# Altium footprint library TYCO THD.PcbLib: 146 footprints (part 2 of 11)
Each footprint in its own frame and in the unit in brackets; x right, y up, seen from the top. Pads: shape width x height; smd on the part's side, far side on the other; paste and mask are expansions set on the pad; w line width, h text height; cw(c..) or ccw(c..) is an arc to the next point about the centre after c.
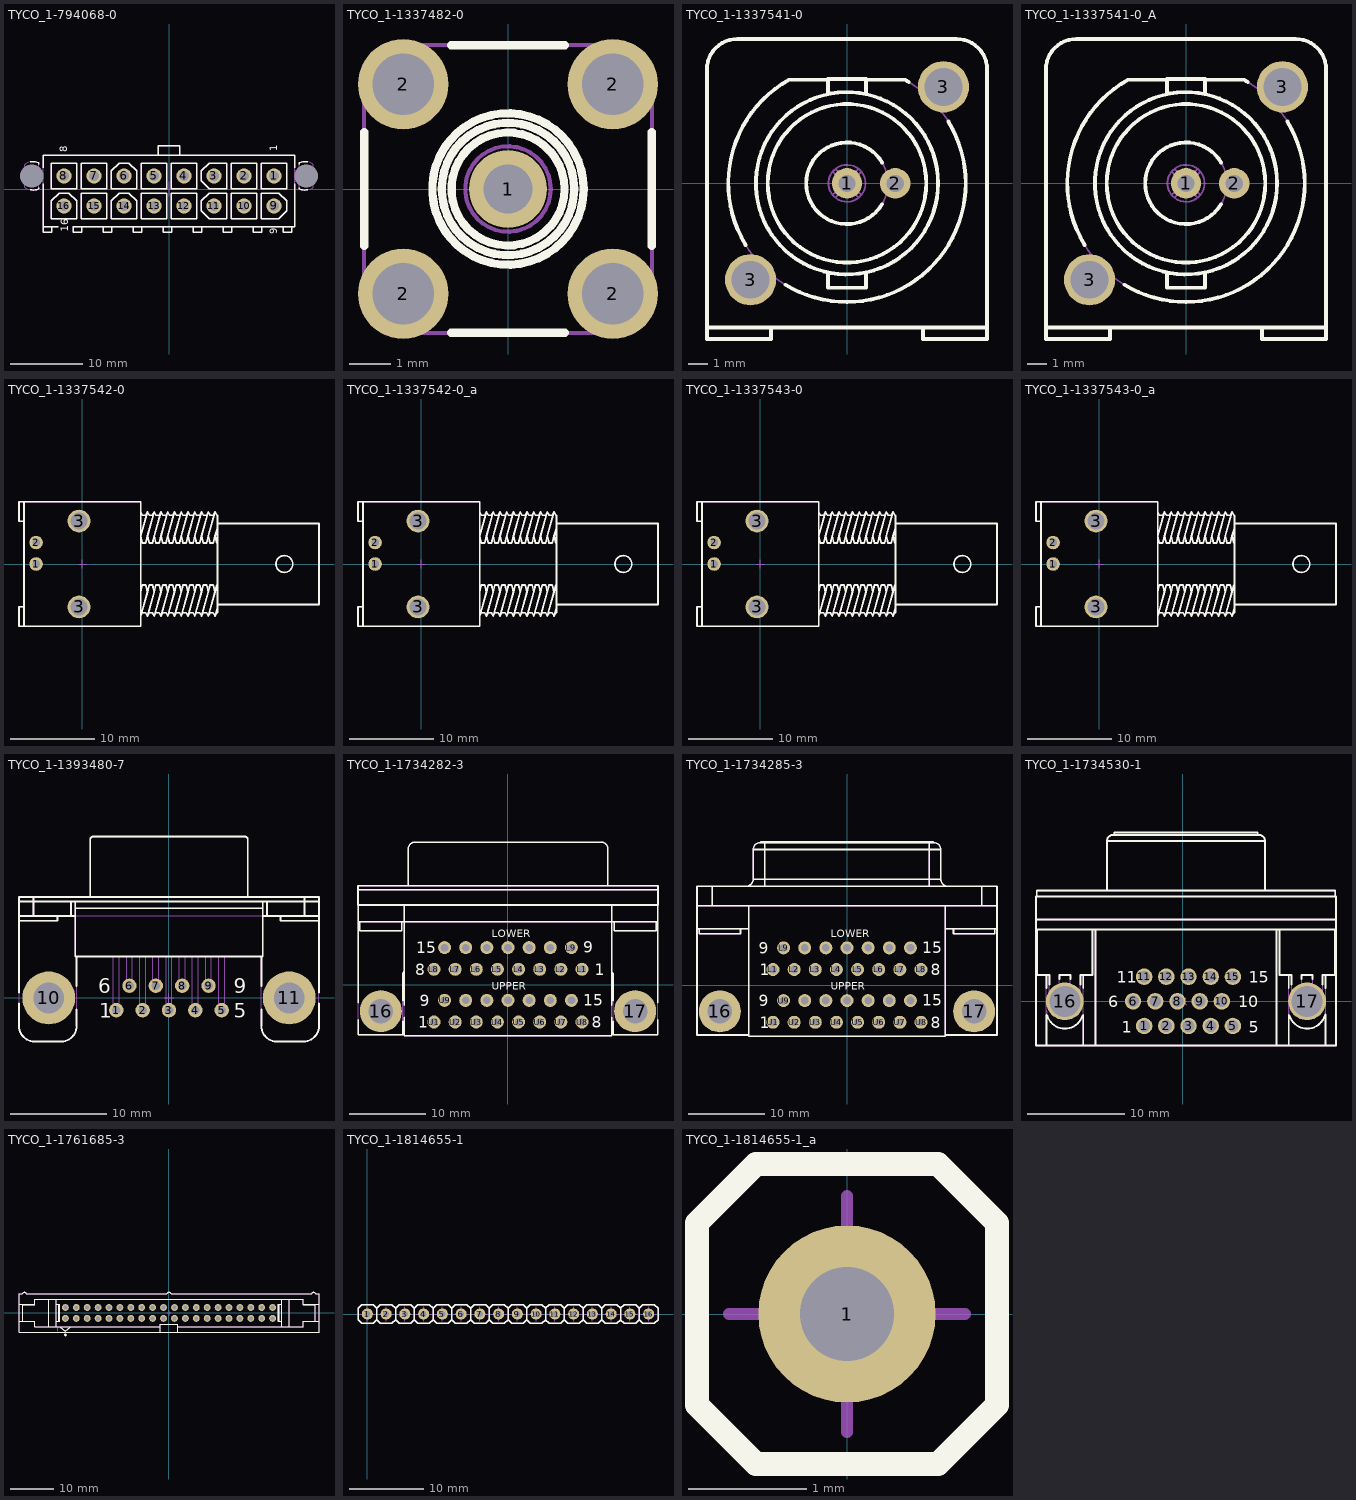
[diagram p1: the footprints below, top view; thin cyan lines are the x and y axes]

## TYCO_1-794068-0 [mm] "16 Circuits Double Row Vertiacal Mini-Universal MATE-N-LOK Connector"
height 14.25
pads (18):
  round 2.1 hole 1.4: 1(14.491,1.816) 2(10.351,1.816) 3(6.21,1.816) 4(2.07,1.816) 5(-2.07,1.816) 6(-6.21,1.816) 7(-10.351,1.816) 8(-14.491,1.816) 9(14.491,-2.324) 10(10.351,-2.324) 11(6.21,-2.324) 12(2.07,-2.324) 13(-2.07,-2.324) 14(-6.21,-2.324) 15(-10.351,-2.324) 16(-14.491,-2.324)
  round 0.5 hole 3.2 unplated mask+1.35: 17(18.941,1.816) 18(-18.941,1.816)
Top Overlay:
  lines w0.2: -19.174,-0.081 ccw(c-18.733,1.837) -17.996,0.012 -17.996,0.207 ; -19.174,3.735 cw(c-18.733,1.816) -17.996,3.642 -17.996,3.446 ; -17.341,-5.169 -17.341,0.746 ; -17.341,2.946 -17.341,4.661 ; -17.336,4.661 17.336,4.661 ; -16.193,-5.169 -16.193,-5.931 -17.336,-5.931 -17.336,-5.169 -15.31,-5.169 ; -13.31,-5.169 17.336,-5.169 ; -13.195,-5.169 -13.195,-5.931 -12.052,-5.931 -12.052,-5.169 ; -9.055,-5.169 -9.055,-5.931 -7.912,-5.931 -7.912,-5.169 ; -4.915,-5.169 -4.915,-5.931 -3.772,-5.931 -3.772,-5.169 ; -1.499,4.661 -1.499,5.956 1.499,5.956 1.499,4.661 ; -0.775,-5.169 -0.775,-5.931 0.368,-5.931 0.368,-5.169 ; 3.366,-5.169 3.366,-5.931 4.509,-5.931 4.509,-5.169 ; 7.506,-5.169 7.506,-5.931 8.649,-5.931 8.649,-5.169 ; 11.646,-5.169 11.646,-5.931 12.789,-5.931 12.789,-5.169 ; 15.786,-5.169 15.786,-5.931 16.929,-5.931 16.929,-5.169 ; 17.341,-5.169 17.341,0.746 ; 17.341,2.946 17.341,4.661 ; 17.996,0.207 17.996,0.012 ccw(c18.733,1.837) 19.174,-0.081 ; 17.996,3.446 17.996,3.642 cw(c18.733,1.816) 19.174,3.735 ; -16.269,-4.102 -16.269,-1.638 -15.177,-0.546 -13.805,-0.546 -12.713,-1.638 -12.713,-4.102 -16.269,-4.102 ; -16.269,0.038 -12.713,0.038 -12.713,3.594 -16.269,3.594 -16.269,0.038 ; -12.129,-4.102 -8.573,-4.102 -8.573,-0.546 -12.129,-0.546 -12.129,-4.102 ; -12.129,0.038 -8.573,0.038 -8.573,3.594 -12.129,3.594 -12.129,0.038 ; -7.988,-4.102 -7.988,-1.638 -6.896,-0.546 -5.525,-0.546 -4.432,-1.638 -4.432,-4.102 -7.988,-4.102 ; -7.988,0.038 -7.988,2.502 -6.896,3.594 -5.525,3.594 -4.432,2.502 -4.432,0.038 -7.988,0.038 ; -3.848,-4.102 -0.292,-4.102 -0.292,-0.546 -3.848,-0.546 -3.848,-4.102 ; -3.848,0.038 -0.292,0.038 -0.292,3.594 -3.848,3.594 -3.848,0.038 ; 0.292,-4.102 3.848,-4.102 3.848,-0.546 0.292,-0.546 0.292,-4.102 ; 0.292,0.038 3.848,0.038 3.848,3.594 0.292,3.594 0.292,0.038 ; 4.432,-3.01 4.432,-1.638 5.525,-0.546 7.988,-0.546 7.988,-4.102 5.525,-4.102 4.432,-3.01 ; 4.432,1.13 4.432,2.502 5.525,3.594 7.988,3.594 7.988,0.038 5.525,0.038 4.432,1.13 ; 8.573,-4.102 12.129,-4.102 12.129,-0.546 8.573,-0.546 8.573,-4.102 ; 8.573,0.038 12.129,0.038 12.129,3.594 8.573,3.594 8.573,0.038 ; 12.713,-4.102 15.177,-4.102 16.269,-3.01 16.269,-1.638 15.177,-0.546 12.713,-0.546 12.713,-4.102 ; 12.713,0.038 16.269,0.038 16.269,3.594 12.713,3.594 12.713,0.038
  text "1" at 14.943,5.231 h1
  text "16" at -13.92,-5.907 h1
  text "9" at 14.96,-6.216 h1
  text "8" at -14.022,5.07 h1
Mechanical 8:
  lines w0.1: -19.941,1.816 -18.941,1.816 ; -18.941,0.816 -18.941,1.816 ; -18.941,2.816 -18.941,1.816 ; -17.941,1.816 -18.941,1.816 ; -15.491,-2.324 -14.491,-2.324 ; -15.491,1.816 -14.491,1.816 ; -14.491,-3.324 -14.491,-2.324 ; -14.491,-1.324 -14.491,-2.324 ; -14.491,0.816 -14.491,1.816 ; -14.491,2.816 -14.491,1.816 ; -13.491,-2.324 -14.491,-2.324 ; -13.491,1.816 -14.491,1.816 ; -11.351,-2.324 -10.351,-2.324 ; -11.351,1.816 -10.351,1.816 ; -10.351,-3.324 -10.351,-2.324 ; -10.351,-1.324 -10.351,-2.324 ; -10.351,0.816 -10.351,1.816 ; -10.351,2.816 -10.351,1.816 ; -9.351,-2.324 -10.351,-2.324 ; -9.351,1.816 -10.351,1.816 ; -7.21,-2.324 -6.21,-2.324 ; -7.21,1.816 -6.21,1.816 ; -6.21,-3.324 -6.21,-2.324 ; -6.21,-1.324 -6.21,-2.324 ; -6.21,0.816 -6.21,1.816 ; -6.21,2.816 -6.21,1.816 ; -5.21,-2.324 -6.21,-2.324 ; -5.21,1.816 -6.21,1.816 ; -3.07,-2.324 -2.07,-2.324 ; -3.07,1.816 -2.07,1.816 ; -2.07,-3.324 -2.07,-2.324 ; -2.07,-1.324 -2.07,-2.324 ; -2.07,0.816 -2.07,1.816 ; -2.07,2.816 -2.07,1.816 ; -1.07,-2.324 -2.07,-2.324 ; -1.07,1.816 -2.07,1.816 ; -1,0 0,0 ; 0,-1 0,0 ; 0,1 0,0 ; 1,0 0,0 ; 1.07,-2.324 2.07,-2.324 ; 1.07,1.816 2.07,1.816 ; 2.07,-3.324 2.07,-2.324 ; 2.07,-1.324 2.07,-2.324 ; 2.07,0.816 2.07,1.816 ; 2.07,2.816 2.07,1.816 ; 3.07,-2.324 2.07,-2.324 ; 3.07,1.816 2.07,1.816 ; 5.21,-2.324 6.21,-2.324 ; 5.21,1.816 6.21,1.816 ; 6.21,-3.324 6.21,-2.324 ; 6.21,-1.324 6.21,-2.324 ; 6.21,0.816 6.21,1.816 ; 6.21,2.816 6.21,1.816 ; 7.21,-2.324 6.21,-2.324 ; 7.21,1.816 6.21,1.816 ; 9.351,-2.324 10.351,-2.324 ; 9.351,1.816 10.351,1.816 ; 10.351,-3.324 10.351,-2.324 ; 10.351,-1.324 10.351,-2.324 ; 10.351,0.816 10.351,1.816 ; 10.351,2.816 10.351,1.816 ; 11.351,-2.324 10.351,-2.324 ; 11.351,1.816 10.351,1.816 ; 13.491,-2.324 14.491,-2.324 ; 13.491,1.816 14.491,1.816 ; 14.491,-3.324 14.491,-2.324 ; 14.491,-1.324 14.491,-2.324 ; 14.491,0.816 14.491,1.816 ; 14.491,2.816 14.491,1.816 ; 15.491,-2.324 14.491,-2.324 ; 15.491,1.816 14.491,1.816 ; 17.941,1.816 18.941,1.816 ; 18.941,0.816 18.941,1.816 ; 18.941,2.816 18.941,1.816 ; 19.941,1.816 18.941,1.816
Mechanical 14:
  lines w0.1: -19.926,0.991 ccw(c-18.961,1.816) -17.996,0.991 ; -19.926,2.642 cw(c-18.961,1.816) -17.996,2.642 ; -17.336,1.054 -17.996,1.054 -17.996,-0.009 cw(c-18.733,1.816) -19.926,0.251 -19.926,3.381 cw(c-18.733,1.816) -17.996,3.642 -17.996,2.578 -17.336,2.578 ; -16.193,-5.169 -16.193,-5.931 -17.336,-5.931 -17.336,-5.169 ; -15.31,-5.169 -17.336,-5.169 ; -13.31,-5.169 17.336,-5.169 17.336,4.661 -17.336,4.661 -17.336,-5.169 ; -13.195,-5.169 -13.195,-5.931 -12.052,-5.931 -12.052,-5.169 ; -9.055,-5.169 -9.055,-5.931 -7.912,-5.931 -7.912,-5.169 ; -4.915,-5.169 -4.915,-5.931 -3.772,-5.931 -3.772,-5.169 ; -1.499,4.661 -1.499,5.956 1.499,5.956 1.499,4.661 ; -0.775,-5.169 -0.775,-5.931 0.368,-5.931 0.368,-5.169 ; 3.366,-5.169 3.366,-5.931 4.509,-5.931 4.509,-5.169 ; 7.506,-5.169 7.506,-5.931 8.649,-5.931 8.649,-5.169 ; 11.646,-5.169 11.646,-5.931 12.789,-5.931 12.789,-5.169 ; 15.786,-5.169 15.786,-5.931 16.929,-5.931 16.929,-5.169 ; 17.336,1.054 17.996,1.054 17.996,-0.009 ccw(c18.733,1.816) 19.926,0.251 19.926,3.381 ccw(c18.733,1.816) 17.996,3.642 17.996,2.578 17.336,2.578 ; 17.996,0.991 ccw(c18.961,1.816) 19.926,0.991 ; 17.996,2.642 cw(c18.961,1.816) 19.926,2.642 ; -16.269,-4.102 -16.269,-1.638 -15.177,-0.546 -13.805,-0.546 -12.713,-1.638 -12.713,-4.102 -16.269,-4.102 ; -16.269,0.038 -12.713,0.038 -12.713,3.594 -16.269,3.594 -16.269,0.038 ; -12.129,-4.102 -8.573,-4.102 -8.573,-0.546 -12.129,-0.546 -12.129,-4.102 ; -12.129,0.038 -8.573,0.038 -8.573,3.594 -12.129,3.594 -12.129,0.038 ; -7.988,-4.102 -4.432,-4.102 -4.432,-1.638 -5.525,-0.546 -6.896,-0.546 -7.988,-1.638 -7.988,-4.102 ; -7.988,0.038 -4.432,0.038 -4.432,2.502 -5.525,3.594 -6.896,3.594 -7.988,2.502 -7.988,0.038 ; -3.848,-4.102 -0.292,-4.102 -0.292,-0.546 -3.848,-0.546 -3.848,-4.102 ; -3.848,0.038 -0.292,0.038 -0.292,3.594 -3.848,3.594 -3.848,0.038 ; 0.292,-4.102 3.848,-4.102 3.848,-0.546 0.292,-0.546 0.292,-4.102 ; 0.292,0.038 3.848,0.038 3.848,3.594 0.292,3.594 0.292,0.038 ; 4.432,-3.01 4.432,-1.638 5.525,-0.546 7.988,-0.546 7.988,-4.102 5.525,-4.102 4.432,-3.01 ; 4.432,1.13 5.525,0.038 7.988,0.038 7.988,3.594 5.525,3.594 4.432,2.502 4.432,1.13 ; 8.573,-4.102 12.129,-4.102 12.129,-0.546 8.573,-0.546 8.573,-4.102 ; 8.573,0.038 12.129,0.038 12.129,3.594 8.573,3.594 8.573,0.038 ; 12.713,-4.102 15.177,-4.102 16.269,-3.01 16.269,-1.638 15.177,-0.546 12.713,-0.546 12.713,-4.102 ; 12.713,0.038 16.269,0.038 16.269,3.594 12.713,3.594 12.713,0.038
  text "1" at 14.943,5.231 h1
  text "16" at -13.92,-5.907 h1
  text "9" at 14.96,-6.216 h1
  text "8" at -14.022,5.07 h1
3D body "TYCO_1-794068-0.stp": height 14.25, standoff -4.06, extent -19.926,-5.931 19.926,5.956

## TYCO_1-1337482-0 [mm] "50 Ohm SMB Straight PCB Socket"
height 7.6
pads (5):
  round 1.9 hole 1.2: 1(0,0)
  round 2.2 hole 1.5: 2(-2.55,-2.55) 2(-2.55,2.55) 2(2.55,-2.55) 2(2.55,2.55)
Top Overlay:
  circle w0.2: c0,0 r1.612
  circle w0.2: c0,0 r1.375
  circle w0.2: c0,0 r1.843
  lines w0.2: -3.5,-1.389 -3.5,1.389 ; -1.389,-3.5 1.389,-3.5 ; -1.389,3.5 1.389,3.5 ; 3.5,-1.389 3.5,1.389
Mechanical 8:
  lines w0.1: -3.05,-2.55 -2.55,-2.55 ; -3.05,2.55 -2.55,2.55 ; -2.55,-3.05 -2.55,-2.55 ; -2.55,-2.05 -2.55,-2.55 ; -2.55,2.05 -2.55,2.55 ; -2.55,3.05 -2.55,2.55 ; -2.05,-2.55 -2.55,-2.55 ; -2.05,2.55 -2.55,2.55 ; -0.5,0 0,0 ; 0,-0.5 0,0 ; 0,0.5 0,0 ; 0.5,0 0,0 ; 2.05,-2.55 2.55,-2.55 ; 2.05,2.55 2.55,2.55 ; 2.55,-3.05 2.55,-2.55 ; 2.55,-2.05 2.55,-2.55 ; 2.55,2.05 2.55,2.55 ; 2.55,3.05 2.55,2.55 ; 3.05,-2.55 2.55,-2.55 ; 3.05,2.55 2.55,2.55
Mechanical 14:
  circle w0.1: c0,0 r0.125
  circle w0.1: c0,0 r1.612
  circle w0.1: c0,0 r0.5
  circle w0.1: c0,0 r1.04
  circle w0.1: c0,0 r1.375
  circle w0.1: c0,0 r1.843
  lines w0.1: -3.5,-3 -3.5,3 -3,3.5 3,3.5 3.5,3 3.5,-3 3,-3.5 -3,-3.5 -3.5,-3
3D body "TYCO_1-1337482-0.stp": height 7.6, standoff -3.9, extent -3.5,-3.5 3.5,3.5

## TYCO_1-1337541-0 [mm] "50 Ohms  BNC Elbow PCB Socket With Mounting Posts"
height 35.5
pads (4):
  round 1.6 hole 0.9: 1(0,0) 2(2.54,0)
  round 2.7 hole 2: 3(-5.08,-5.08) 3(5.08,5.08)
Top Overlay:
  circle w0.2: c0,0 r4.175
  circle w0.2: c0,0 r4.8
  lines w0.2: -7.38,-7.6 7.38,-7.6 ; -5.34,-3.248 cw(c0,0) -3.06,5.45 -1,5.45 ; -4,-7.6 -4,-8.2 -7.38,-8.2 -7.38,6 cw(c-5.78,6) -5.78,7.6 5.78,7.6 cw(c5.78,6) 7.38,6 7.38,-8.2 4,-8.2 4,-7.6 ; -3.248,-5.34 ccw(c0,0) 5.34,3.248 ; -1,-4.695 -1,-5.5 1,-5.5 1,-4.695 ; -1,4.695 -1,5.5 1,5.5 1,4.695 ; 1,5.45 3.06,5.45 cw(c0,0) 3.248,5.34 ; 1.847,-1.1 cw(c0,0) 1.847,1.1
Mechanical 8:
  lines w0.1: -5.58,-5.08 -5.08,-5.08 ; -5.08,-5.58 -5.08,-5.08 ; -5.08,-4.58 -5.08,-5.08 ; -4.58,-5.08 -5.08,-5.08 ; -0.5,0 0,0 ; 0,-0.5 0,0 ; 0,0.5 0,0 ; 0.5,0 0,0 ; 2.04,0 2.54,0 ; 2.54,-0.5 2.54,0 ; 2.54,0.5 2.54,0 ; 3.04,0 2.54,0 ; 4.58,5.08 5.08,5.08 ; 5.08,4.58 5.08,5.08 ; 5.08,5.58 5.08,5.08 ; 5.58,5.08 5.08,5.08
Mechanical 14:
  circle w0.1: c0,0 r0.975
  circle w0.1: c0,0 r0.625
  circle w0.1: c0,0 r2.15
  circle w0.1: c0,0 r4.175
  circle w0.1: c0,0 r4.8
  lines w0.1: -7.38,-7.6 7.38,-7.6 ; -4,-7.6 -4,-8.2 -7.38,-8.2 -7.38,6 cw(c-5.78,6) -5.78,7.6 5.78,7.6 cw(c5.78,6) 7.38,6 7.38,-8.2 4,-8.2 4,-7.6 ; -1,-4.695 -1,-5.5 1,-5.5 1,-4.695 ; -1,4.695 -1,5.5 1,5.5 1,4.695 ; -1,5.45 -3.06,5.45 ccw(c0,0) 3.06,5.45 1,5.45 ; -0.757,-0.615 -0.507,-0.366 ; -0.757,0.615 -0.507,0.366 ; -0.615,-0.757 -0.366,-0.507 ; -0.615,0.757 -0.366,0.507 ; 0.366,-0.507 0.615,-0.757 ; 0.366,0.507 0.615,0.757 ; 0.507,-0.366 0.757,-0.615 ; 0.507,0.366 0.757,0.615
3D body "TYCO_1-1337541-0.stp": height 35.5, standoff -4.25, extent -7.38,-8.2 7.38,7.6

## TYCO_1-1337541-0_A [mm] "50 Ohms  BNC Elbow PCB Socket With Mounting Posts"
height 35.5
pads (4):
  round 1.6 hole 0.9: 1(0,0) 2(2.54,0)
  round 2.7 hole 2: 3(-5.08,-5.08) 3(5.08,5.08)
Top Overlay:
  circle w0.2: c0,0 r4.8
  circle w0.2: c0,0 r4.175
  lines w0.2: -7.38,-7.6 7.38,-7.6 ; -5.34,-3.248 cw(c0,0) -3.06,5.45 -1,5.45 ; -4,-7.6 -4,-8.2 -7.38,-8.2 -7.38,6 cw(c-5.78,6) -5.78,7.6 5.78,7.6 cw(c5.78,6) 7.38,6 7.38,-8.2 4,-8.2 4,-7.6 ; -3.248,-5.34 ccw(c0,0) 5.34,3.248 ; -1,-4.695 -1,-5.5 1,-5.5 1,-4.695 ; -1,4.695 -1,5.5 1,5.5 1,4.695 ; 1,5.45 3.06,5.45 cw(c0,0) 3.248,5.34 ; 1.847,-1.1 cw(c0,0) 1.847,1.1
Mechanical 8:
  lines w0.1: -5.58,-5.08 -5.08,-5.08 ; -5.08,-5.58 -5.08,-5.08 ; -5.08,-4.58 -5.08,-5.08 ; -4.58,-5.08 -5.08,-5.08 ; -0.5,0 0,0 ; 0,-0.5 0,0 ; 0,0.5 0,0 ; 0.5,0 0,0 ; 2.04,0 2.54,0 ; 2.54,-0.5 2.54,0 ; 2.54,0.5 2.54,0 ; 3.04,0 2.54,0 ; 4.58,5.08 5.08,5.08 ; 5.08,4.58 5.08,5.08 ; 5.08,5.58 5.08,5.08 ; 5.58,5.08 5.08,5.08
Mechanical 14:
  circle w0.1: c0,0 r4.8
  circle w0.1: c0,0 r4.175
  circle w0.1: c0,0 r2.15
  circle w0.1: c0,0 r0.625
  circle w0.1: c0,0 r0.975
  lines w0.1: -7.38,-7.6 7.38,-7.6 ; -4,-7.6 -4,-8.2 -7.38,-8.2 -7.38,6 cw(c-5.78,6) -5.78,7.6 5.78,7.6 cw(c5.78,6) 7.38,6 7.38,-8.2 4,-8.2 4,-7.6 ; -1,-4.695 -1,-5.5 1,-5.5 1,-4.695 ; -1,4.695 -1,5.5 1,5.5 1,4.695 ; -1,5.45 -3.06,5.45 ccw(c0,0) 3.06,5.45 1,5.45 ; -0.757,-0.615 -0.507,-0.366 ; -0.757,0.615 -0.507,0.366 ; -0.615,-0.757 -0.366,-0.507 ; -0.615,0.757 -0.366,0.507 ; 0.366,-0.507 0.615,-0.757 ; 0.366,0.507 0.615,0.757 ; 0.507,-0.366 0.757,-0.615 ; 0.507,0.366 0.757,0.615
3D body "TYCO_1-1337541-0.stp": height 35.5, standoff -4.25, extent -7.38,-8.2 7.38,7.6
3D body "TYCO_1-1634816-0_a.stp": height 17.6, standoff 15.1, extent -7,-8.083 7,8.083
3D body "TYCO_1-1634817-0_a.stp": height 15.07, standoff 14.3, extent -7.9,-7.9 7.9,7.9

## TYCO_1-1337542-0 [mm] "50 Ohms  BNC Elbow PCB Socket With Mounting Posts"
height 13.16
pads (4):
  round 1.6 hole 0.9: 1(-5.48,0) 2(-5.48,2.54)
  round 2.7 hole 2: 3(-0.4,-5.08) 3(-0.4,5.08)
Top Overlay:
  drawing of 177 lines, arcs and shapes, not listed
Mechanical 8:
  lines w0.1: -5.98,0 -5.48,0 ; -5.98,2.54 -5.48,2.54 ; -5.48,-0.5 -5.48,0 ; -5.48,0.5 -5.48,0 ; -5.48,2.04 -5.48,2.54 ; -5.48,3.04 -5.48,2.54 ; -4.98,0 -5.48,0 ; -4.98,2.54 -5.48,2.54 ; -0.9,-5.08 -0.4,-5.08 ; -0.9,5.08 -0.4,5.08 ; -0.5,0 0,0 ; -0.4,-5.58 -0.4,-5.08 ; -0.4,-4.58 -0.4,-5.08 ; -0.4,4.58 -0.4,5.08 ; -0.4,5.58 -0.4,5.08 ; 0,-0.5 0,0 ; 0,0.5 0,0 ; 0.1,-5.08 -0.4,-5.08 ; 0.1,5.08 -0.4,5.08 ; 0.5,0 0,0
Mechanical 14:
  drawing of 177 lines, arcs and shapes, not listed
3D body "TYCO_1-1337542-0.stp": height 13.16, standoff -4.3, extent -7.5,-7.35 28,7.35

## TYCO_1-1337542-0_a [mm] "50 Ohms  BNC Elbow PCB Socket With Mounting Posts"
height 13.16
pads (4):
  round 1.6 hole 0.9: 1(-5.48,0) 2(-5.48,2.54)
  round 2.7 hole 2: 3(-0.4,-5.08) 3(-0.4,5.08)
Top Overlay:
  drawing of 177 lines, arcs and shapes, not listed
Mechanical 8:
  lines w0.1: -5.98,0 -5.48,0 ; -5.98,2.54 -5.48,2.54 ; -5.48,-0.5 -5.48,0 ; -5.48,0.5 -5.48,0 ; -5.48,2.04 -5.48,2.54 ; -5.48,3.04 -5.48,2.54 ; -4.98,0 -5.48,0 ; -4.98,2.54 -5.48,2.54 ; -0.9,-5.08 -0.4,-5.08 ; -0.9,5.08 -0.4,5.08 ; -0.5,0 0,0 ; -0.4,-5.58 -0.4,-5.08 ; -0.4,-4.58 -0.4,-5.08 ; -0.4,4.58 -0.4,5.08 ; -0.4,5.58 -0.4,5.08 ; 0,-0.5 0,0 ; 0,0.5 0,0 ; 0.1,-5.08 -0.4,-5.08 ; 0.1,5.08 -0.4,5.08 ; 0.5,0 0,0
Mechanical 14:
  drawing of 177 lines, arcs and shapes, not listed
3D body "TYCO_1-1634416-0.stp": height 13.85, standoff -0.15, extent 7.67,-8.083 10.17,8.083
3D body "TYCO_1-1634817-0.stp": height 14.79, standoff -1.01, extent 6.9,-7.916 7.67,7.884
3D body "TYCO_1-1337542-0.stp": height 13.16, standoff -4.3, extent -7.5,-7.35 28,7.35

## TYCO_1-1337543-0 [mm] "50 Ohms  BNC Elbow PCB Socket With Mounting Posts"
height 15.8
pads (4):
  round 1.6 hole 0.9: 1(-5.48,0) 2(-5.48,2.54)
  round 2.7 hole 2: 3(-0.4,-5.08) 3(-0.4,5.08)
Top Overlay:
  drawing of 177 lines, arcs and shapes, not listed
Mechanical 8:
  lines w0.1: -5.98,0 -5.48,0 ; -5.98,2.54 -5.48,2.54 ; -5.48,-0.5 -5.48,0 ; -5.48,0.5 -5.48,0 ; -5.48,2.04 -5.48,2.54 ; -5.48,3.04 -5.48,2.54 ; -4.98,0 -5.48,0 ; -4.98,2.54 -5.48,2.54 ; -0.9,-5.08 -0.4,-5.08 ; -0.9,5.08 -0.4,5.08 ; -0.5,0 0,0 ; -0.4,-5.58 -0.4,-5.08 ; -0.4,-4.58 -0.4,-5.08 ; -0.4,4.58 -0.4,5.08 ; -0.4,5.58 -0.4,5.08 ; 0,-0.5 0,0 ; 0,0.5 0,0 ; 0.1,-5.08 -0.4,-5.08 ; 0.1,5.08 -0.4,5.08 ; 0.5,0 0,0
Mechanical 14:
  drawing of 177 lines, arcs and shapes, not listed
3D body "TYCO_1-1337543-0.stp": height 15.8, standoff -3.8, extent -7.5,-7.35 28,7.35

## TYCO_1-1337543-0_a [mm] "50 Ohms  BNC Elbow PCB Socket With Mounting Posts + Mount Nut + Lockwasher"
height 15.8
pads (4):
  round 1.6 hole 0.9: 1(-5.48,0) 2(-5.48,2.54)
  round 2.7 hole 2: 3(-0.4,-5.08) 3(-0.4,5.08)
Top Overlay:
  drawing of 177 lines, arcs and shapes, not listed
Mechanical 8:
  lines w0.1: -5.98,0 -5.48,0 ; -5.98,2.54 -5.48,2.54 ; -5.48,-0.5 -5.48,0 ; -5.48,0.5 -5.48,0 ; -5.48,2.04 -5.48,2.54 ; -5.48,3.04 -5.48,2.54 ; -4.98,0 -5.48,0 ; -4.98,2.54 -5.48,2.54 ; -0.9,-5.08 -0.4,-5.08 ; -0.9,5.08 -0.4,5.08 ; -0.5,0 0,0 ; -0.4,-5.58 -0.4,-5.08 ; -0.4,-4.58 -0.4,-5.08 ; -0.4,4.58 -0.4,5.08 ; -0.4,5.58 -0.4,5.08 ; 0,-0.5 0,0 ; 0,0.5 0,0 ; 0.1,-5.08 -0.4,-5.08 ; 0.1,5.08 -0.4,5.08 ; 0.5,0 0,0
Mechanical 14:
  drawing of 177 lines, arcs and shapes, not listed
3D body "TYCO_1-1337543-0.stp": height 15.8, standoff -3.8, extent -7.5,-7.35 28,7.35
3D body "TYCO_1-1634817-0.stp": height 16.04, standoff 0.24, extent 6.9,-7.916 7.67,7.884
3D body "TYCO_1-1634416-0.stp": height 15.1, standoff 1.1, extent 7.67,-8.083 10.17,8.083

## TYCO_1-1393480-7 [mm] "Right Angle D-SUB 9 Female Contacts for PCB, with Grounding Straps, Without Grounding Indents, and Without Mating Connector Lock"
height 10.06
pads (11):
  round 1.5 hole 0.9: 1(-5.48,-1.27) 2(-2.74,-1.27) 3(0,-1.27) 4(2.74,-1.27) 5(5.48,-1.27) 6(-4.11,1.27) 7(-1.37,1.27) 8(1.37,1.27) 9(4.11,1.27)
  round 5.5 hole 3.2: 10(-12.5,0) 11(12.5,0)
Top Overlay:
  lines w0.2: -15.595,-0.586 -15.595,-2.92 ccw(c-13.995,-2.92) -13.995,-4.52 -11.195,-4.52 ccw(c-11.195,-2.92) -9.595,-2.92 -9.595,-1.218 ; -15.595,0.586 -15.595,10.48 15.595,10.48 15.595,0.586 ; -15.595,8.03 -11.595,8.03 -11.595,8.53 ; -15.595,8.53 -9.75,8.53 ; -15.595,10.03 15.595,10.03 ; -14.095,8.53 -14.095,10.48 ; -10.195,8.53 -10.195,10.03 ; -9.75,9.33 9.75,9.33 ; -9.75,10.03 -9.75,4.33 9.75,4.33 9.75,10.03 ; -9.595,1.218 -9.595,4.33 ; -8.19,10.48 -8.19,16.48 cw(c-7.89,16.48) -7.89,16.78 7.89,16.78 cw(c7.89,16.48) 8.19,16.48 8.19,10.48 ; 9.595,-1.218 9.595,-2.92 ccw(c11.195,-2.92) 11.195,-4.52 13.995,-4.52 ccw(c13.995,-2.92) 15.595,-2.92 15.595,-0.586 ; 9.595,1.218 9.595,4.33 ; 9.75,8.53 15.595,8.53 ; 10.195,8.53 10.195,10.03 ; 11.595,8.53 11.595,8.03 15.595,8.03 ; 14.095,8.53 14.095,10.48
  text "9" at 6.731,0.508 h1.5
  text "1" at -7.239,-2.032 h1.5
  text "5" at 6.731,-2.032 h1.5
  text "6" at -7.366,0.508 h1.5
Mechanical 8:
  lines w0.1: -15.595,8.53 0,8.53 15.595,8.53 ; -13,0 -12.5,0 ; -12.5,-0.5 -12.5,0 ; -12.5,0.5 -12.5,0 ; -12,0 -12.5,0 ; -5.98,-1.27 -5.48,-1.27 ; -5.48,-1.77 -5.48,-1.27 ; -5.48,-0.77 -5.48,-1.27 ; -4.98,-1.27 -5.48,-1.27 ; -4.61,1.27 -4.11,1.27 ; -4.11,0.77 -4.11,1.27 ; -4.11,1.77 -4.11,1.27 ; -3.61,1.27 -4.11,1.27 ; -3.24,-1.27 -2.74,-1.27 ; -2.74,-1.77 -2.74,-1.27 ; -2.74,-0.77 -2.74,-1.27 ; -2.24,-1.27 -2.74,-1.27 ; -1.87,1.27 -1.37,1.27 ; -1.37,0.77 -1.37,1.27 ; -1.37,1.77 -1.37,1.27 ; -0.87,1.27 -1.37,1.27 ; -0.5,-1.27 0,-1.27 ; -0.5,0 0,0 ; 0,-1.77 0,-1.27 ; 0,-0.77 0,-1.27 ; 0,-0.5 0,0 ; 0,0.5 0,0 ; 0.5,-1.27 0,-1.27 ; 0.5,0 0,0 ; 0.87,1.27 1.37,1.27 ; 1.37,0.77 1.37,1.27 ; 1.37,1.77 1.37,1.27 ; 1.87,1.27 1.37,1.27 ; 2.24,-1.27 2.74,-1.27 ; 2.74,-1.77 2.74,-1.27 ; 2.74,-0.77 2.74,-1.27 ; 3.24,-1.27 2.74,-1.27 ; 3.61,1.27 4.11,1.27 ; 4.11,0.77 4.11,1.27 ; 4.11,1.77 4.11,1.27 ; 4.61,1.27 4.11,1.27 ; 4.98,-1.27 5.48,-1.27 ; 5.48,-1.77 5.48,-1.27 ; 5.48,-0.77 5.48,-1.27 ; 5.98,-1.27 5.48,-1.27 ; 12,0 12.5,0 ; 12.5,-0.5 12.5,0 ; 12.5,0.5 12.5,0 ; 13,0 12.5,0
Mechanical 14:
  circle w0.1: c-12.5,0 r1.55
  circle w0.1: c12.5,0 r1.55
  lines w0.1: -15.595,8.03 -11.595,8.03 -11.595,8.53 ; -15.595,8.53 -9.75,8.53 ; -15.595,10.03 15.595,10.03 ; -14.095,8.53 -14.095,10.48 ; -10.195,8.53 -10.195,10.03 ; -9.75,9.33 9.75,9.33 ; -9.75,10.03 -9.75,4.33 9.75,4.33 9.75,10.03 ; -9.595,4.33 -9.595,-2.92 cw(c-11.195,-2.92) -11.195,-4.52 -13.995,-4.52 cw(c-13.995,-2.92) -15.595,-2.92 -15.595,10.48 15.595,10.48 15.595,-2.92 cw(c13.995,-2.92) 13.995,-4.52 11.195,-4.52 cw(c11.195,-2.92) 9.595,-2.92 9.595,4.33 ; -8.19,10.48 -8.19,16.48 cw(c-7.89,16.48) -7.89,16.78 7.89,16.78 cw(c7.89,16.48) 8.19,16.48 8.19,10.48 ; -5.78,4.33 -5.78,-1.42 -5.18,-1.42 -5.18,4.33 ; -4.41,4.33 -4.41,1.12 -3.81,1.12 -3.81,4.33 ; -3.04,4.33 -3.04,-1.42 -2.44,-1.42 -2.44,4.33 ; -1.67,4.33 -1.67,1.12 -1.07,1.12 -1.07,4.33 ; -0.3,4.33 -0.3,-1.42 0.3,-1.42 0.3,4.33 ; 1.07,4.33 1.07,1.12 1.67,1.12 1.67,4.33 ; 2.44,4.33 2.44,-1.42 3.04,-1.42 3.04,4.33 ; 3.81,4.33 3.81,1.12 4.41,1.12 4.41,4.33 ; 5.18,4.33 5.18,-1.42 5.78,-1.42 5.78,4.33 ; 9.75,8.53 15.595,8.53 ; 10.195,8.53 10.195,10.03 ; 11.595,8.53 11.595,8.03 15.595,8.03 ; 14.095,8.53 14.095,10.48
3D body "TYCO_1-1393480-7.stp": height 10.06, standoff -3.2, extent -15.595,-4.52 15.595,16.78
